# Altium footprint library komponenty_ITS_v1.PcbLib: 81 footprints (part 3 of 6)
Each footprint in its own frame and in the unit in brackets; x right, y up, seen from the top. Pads: shape width x height; smd on the part's side, far side on the other; paste and mask are expansions set on the pad; w line width, h text height; cw(c..) or ccw(c..) is an arc to the next point about the centre after c.
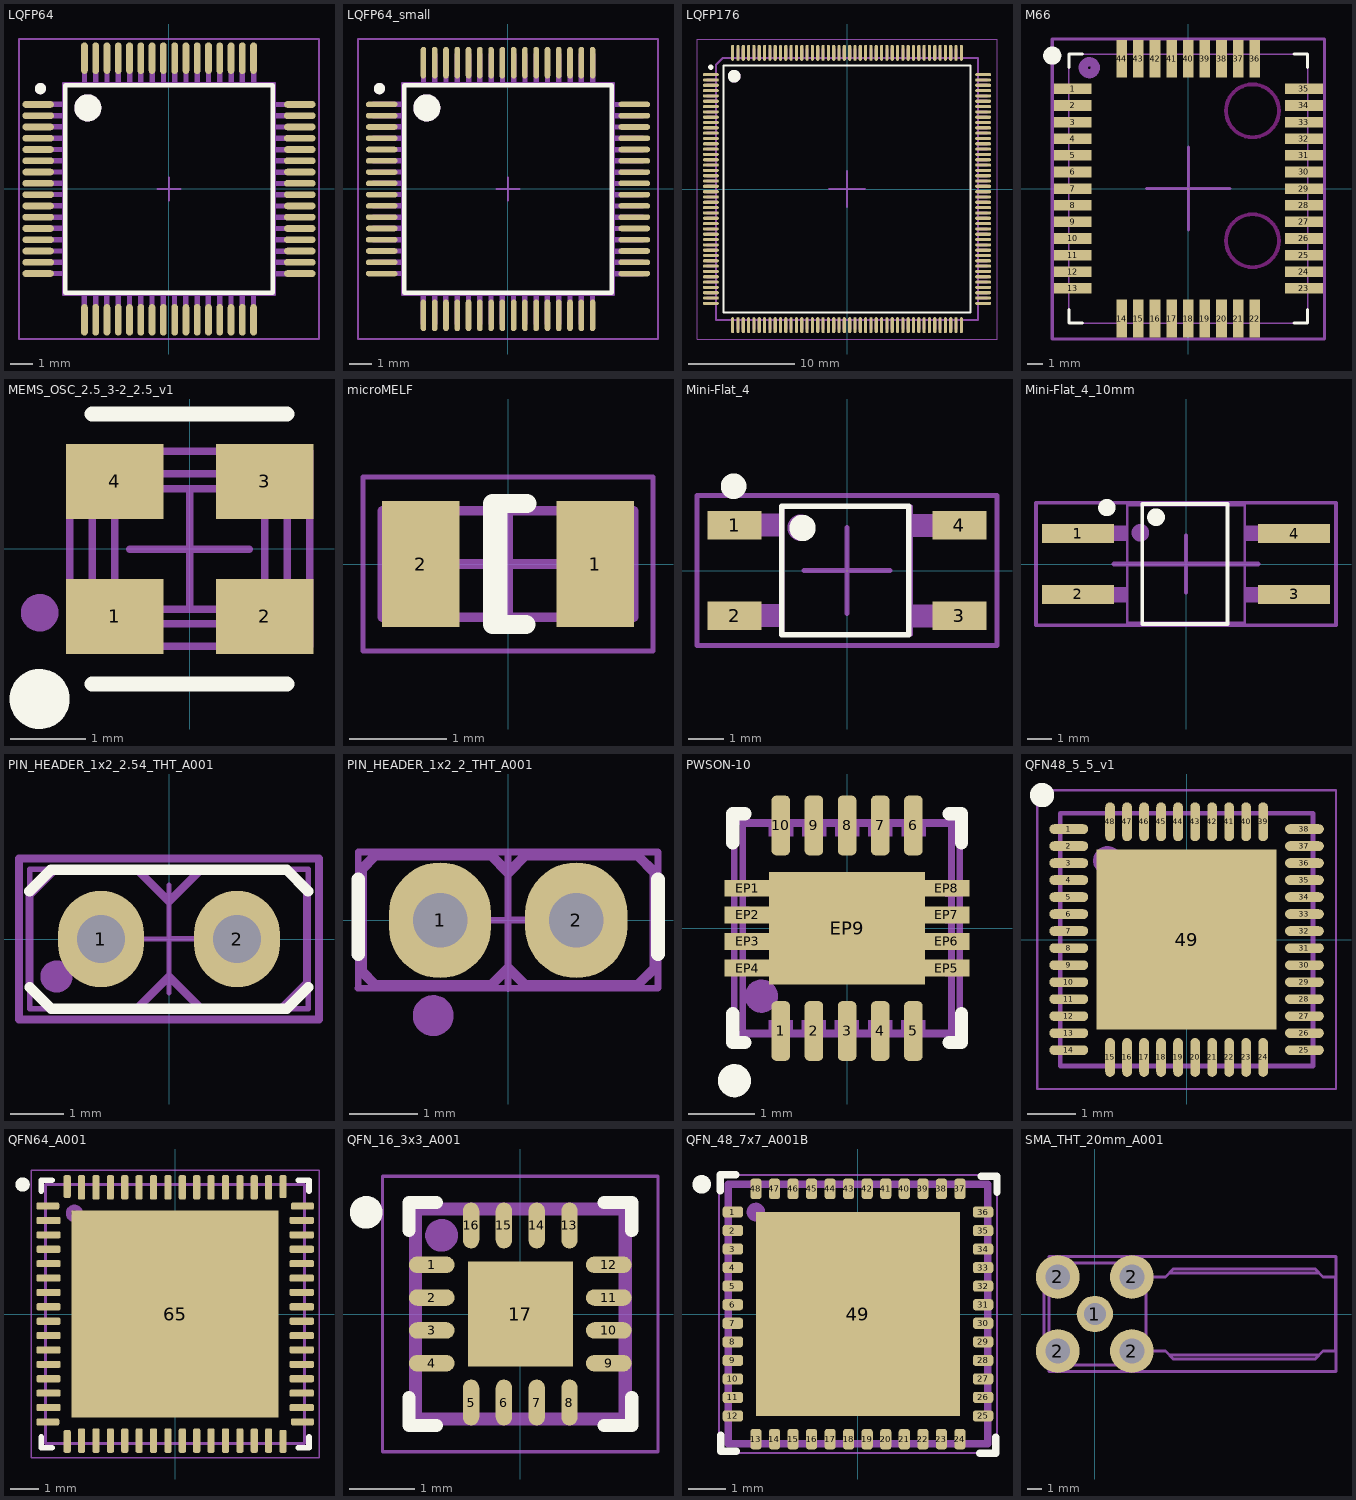
[diagram p2: the footprints below, top view; thin cyan lines are the x and y axes]

## LQFP64 [mm] "TSQFP, 64-Leads, Body 10,00x10,00mm, Pitch 0,50mm"
height 1.6
pads (64):
  oval 1.4x0.3 smd: 1(-5.8,3.75) 2(-5.8,3.25) 3(-5.8,2.75) 4(-5.8,2.25) 5(-5.8,1.75) 6(-5.8,1.25) 7(-5.8,0.75) 8(-5.8,0.25) 9(-5.8,-0.25) 10(-5.8,-0.75) 11(-5.8,-1.25) 12(-5.8,-1.75) 13(-5.8,-2.25) 14(-5.8,-2.75) 15(-5.8,-3.25) 16(-5.8,-3.75) 33(5.8,-3.75) 34(5.8,-3.25) 35(5.8,-2.75) 36(5.8,-2.25) 37(5.8,-1.75) 38(5.8,-1.25) 39(5.8,-0.75) 40(5.8,-0.25) 41(5.8,0.25) 42(5.8,0.75) 43(5.8,1.25) 44(5.8,1.75) 45(5.8,2.25) 46(5.8,2.75) 47(5.8,3.25) 48(5.8,3.75)
  oval 0.3x1.4 smd: 17(-3.75,-5.8) 18(-3.25,-5.8) 19(-2.75,-5.8) 20(-2.25,-5.8) 21(-1.75,-5.8) 22(-1.25,-5.8) 23(-0.75,-5.8) 24(-0.25,-5.8) 25(0.25,-5.8) 26(0.75,-5.8) 27(1.25,-5.8) 28(1.75,-5.8) 29(2.25,-5.8) 30(2.75,-5.8) 31(3.25,-5.8) 32(3.75,-5.8) 49(3.75,5.8) 50(3.25,5.8) 51(2.75,5.8) 52(2.25,5.8) 53(1.75,5.8) 54(1.25,5.8) 55(0.75,5.8) 56(0.25,5.8) 57(-0.25,5.8) 58(-0.75,5.8) 59(-1.25,5.8) 60(-1.75,5.8) 61(-2.25,5.8) 62(-2.75,5.8) 63(-3.25,5.8) 64(-3.75,5.8)
Top Overlay:
  circle w0.6: c-3.6,3.6 r0.3
  circle w0.25: c-5.7,4.45 r0.125
  lines w0.2: -4.6,-4.6 4.6,-4.6 4.6,4.6 -4.6,4.6 -4.6,-4.6
Top M11-12_SMOT:
  circle w0.6: c-3.6,3.6 r0.3
  circle w0.25: c-5.7,4.45 r0.125
  region: 4.707,3.866 4.707,3.628 6.006,3.628 6.006,3.866
  region: 4.707,3.366 4.707,3.128 6.006,3.128 6.006,3.366
  region: 4.707,2.866 4.707,2.628 6.006,2.628 6.006,2.866
  region: 4.707,2.366 4.707,2.128 6.006,2.128 6.006,2.366
  region: 4.707,1.866 4.707,1.628 6.006,1.628 6.006,1.866
  region: 4.707,1.366 4.707,1.128 6.006,1.128 6.006,1.366
  region: 4.707,0.866 4.707,0.628 6.006,0.628 6.006,0.866
  region: 4.707,0.366 4.707,0.128 6.006,0.128 6.006,0.366
  region: 4.707,-0.134 4.707,-0.372 6.006,-0.372 6.006,-0.134
  region: 4.707,-0.634 4.707,-0.872 6.006,-0.872 6.006,-0.634
  region: 4.707,-1.134 4.707,-1.372 6.006,-1.372 6.006,-1.134
  region: 4.707,-1.634 4.707,-1.872 6.006,-1.872 6.006,-1.634
  region: 4.707,-2.134 4.707,-2.372 6.006,-2.372 6.006,-2.134
  region: 4.707,-2.634 4.707,-2.872 6.006,-2.872 6.006,-2.634
  region: 4.707,-3.134 4.707,-3.372 6.006,-3.372 6.006,-3.134
  region: 4.707,-3.634 4.707,-3.872 6.006,-3.872 6.006,-3.634
  rectangle: 2.134,4.707 2.372,6.006
  rectangle: 2.634,4.707 2.872,6.006
  rectangle: 3.134,4.707 3.372,6.006
  rectangle: 3.634,4.707 3.872,6.006
  region: 3.866,-4.707 3.628,-4.707 3.628,-6.006 3.866,-6.006
  region: 3.366,-4.707 3.128,-4.707 3.128,-6.006 3.366,-6.006
  region: 2.866,-4.707 2.628,-4.707 2.628,-6.006 2.866,-6.006
  region: 2.366,-4.707 2.128,-4.707 2.128,-6.006 2.366,-6.006
  rectangle: 0.134,4.707 0.372,6.006
  rectangle: 0.634,4.707 0.872,6.006
  rectangle: 1.134,4.707 1.372,6.006
  rectangle: 1.634,4.707 1.872,6.006
  region: 1.866,-4.707 1.628,-4.707 1.628,-6.006 1.866,-6.006
  region: 1.366,-4.707 1.128,-4.707 1.128,-6.006 1.366,-6.006
  region: 0.866,-4.707 0.628,-4.707 0.628,-6.006 0.866,-6.006
  region: 0.366,-4.707 0.128,-4.707 0.128,-6.006 0.366,-6.006
  rectangle: -1.866,4.707 -1.628,6.006
  rectangle: -1.366,4.707 -1.128,6.006
  rectangle: -0.866,4.707 -0.628,6.006
  rectangle: -0.366,4.707 -0.128,6.006
  region: -0.134,-4.707 -0.372,-4.707 -0.372,-6.006 -0.134,-6.006
  region: -0.634,-4.707 -0.872,-4.707 -0.872,-6.006 -0.634,-6.006
  region: -1.134,-4.707 -1.372,-4.707 -1.372,-6.006 -1.134,-6.006
  region: -1.634,-4.707 -1.872,-4.707 -1.872,-6.006 -1.634,-6.006
  rectangle: -3.866,4.707 -3.628,6.006
  rectangle: -3.366,4.707 -3.128,6.006
  rectangle: -2.866,4.707 -2.628,6.006
  rectangle: -2.366,4.707 -2.128,6.006
  region: -2.134,-4.707 -2.372,-4.707 -2.372,-6.006 -2.134,-6.006
  region: -2.634,-4.707 -2.872,-4.707 -2.872,-6.006 -2.634,-6.006
  region: -3.134,-4.707 -3.372,-4.707 -3.372,-6.006 -3.134,-6.006
  region: -3.634,-4.707 -3.872,-4.707 -3.872,-6.006 -3.634,-6.006
  region: -4.707,2.134 -4.707,2.372 -6.006,2.372 -6.006,2.134
  region: -4.707,2.634 -4.707,2.872 -6.006,2.872 -6.006,2.634
  region: -4.707,3.134 -4.707,3.372 -6.006,3.372 -6.006,3.134
  region: -4.707,3.634 -4.707,3.872 -6.006,3.872 -6.006,3.634
  region: -4.707,0.134 -4.707,0.372 -6.006,0.372 -6.006,0.134
  region: -4.707,0.634 -4.707,0.872 -6.006,0.872 -6.006,0.634
  region: -4.707,1.134 -4.707,1.372 -6.006,1.372 -6.006,1.134
  region: -4.707,1.634 -4.707,1.872 -6.006,1.872 -6.006,1.634
  region: -4.707,-1.866 -4.707,-1.628 -6.006,-1.628 -6.006,-1.866
  region: -4.707,-1.366 -4.707,-1.128 -6.006,-1.128 -6.006,-1.366
  region: -4.707,-0.866 -4.707,-0.628 -6.006,-0.628 -6.006,-0.866
  region: -4.707,-0.366 -4.707,-0.128 -6.006,-0.128 -6.006,-0.366
  region: -4.707,-3.866 -4.707,-3.628 -6.006,-3.628 -6.006,-3.866
  region: -4.707,-3.366 -4.707,-3.128 -6.006,-3.128 -6.006,-3.366
  region: -4.707,-2.866 -4.707,-2.628 -6.006,-2.628 -6.006,-2.866
  region: -4.707,-2.366 -4.707,-2.128 -6.006,-2.128 -6.006,-2.366
  lines w0.1: -4.7,-4.7 4.7,-4.7 4.7,4.7 -4.7,4.7 -4.7,-4.7
Top M13-14_SDES:
  text "'.Designator'" at -6.798,-0.5 h1.2
M15_orgin:
  lines w0.1: -0.5,0 0.5,0 ; 0,-0.5 0,0.5 ; -6.65,-6.65 6.65,-6.65 6.65,6.65 -6.65,6.65 -6.65,-6.65
3D body "LQFP64.step": height 1.6, standoff 0, extent -6,-6 6,6

## LQFP64_small [mm] "TSQFP, 64-Leads, Body 10,00x10,00mm, Pitch 0,50mm"
height 1.6
pads (64):
  oval 1.4x0.25 smd: 1(-5.6,3.75) 2(-5.6,3.25) 3(-5.6,2.75) 4(-5.6,2.25) 5(-5.6,1.75) 6(-5.6,1.25) 7(-5.6,0.75) 8(-5.6,0.25) 9(-5.6,-0.25) 10(-5.6,-0.75) 11(-5.6,-1.25) 12(-5.6,-1.75) 13(-5.6,-2.25) 14(-5.6,-2.75) 15(-5.6,-3.25) 16(-5.6,-3.75) 33(5.6,-3.75) 34(5.6,-3.25) 35(5.6,-2.75) 36(5.6,-2.25) 37(5.6,-1.75) 38(5.6,-1.25) 39(5.6,-0.75) 40(5.6,-0.25) 41(5.6,0.25) 42(5.6,0.75) 43(5.6,1.25) 44(5.6,1.75) 45(5.6,2.25) 46(5.6,2.75) 47(5.6,3.25) 48(5.6,3.75)
  oval 0.25x1.4 smd: 17(-3.75,-5.6) 18(-3.25,-5.6) 19(-2.75,-5.6) 20(-2.25,-5.6) 21(-1.75,-5.6) 22(-1.25,-5.6) 23(-0.75,-5.6) 24(-0.25,-5.6) 25(0.25,-5.6) 26(0.75,-5.6) 27(1.25,-5.6) 28(1.75,-5.6) 29(2.25,-5.6) 30(2.75,-5.6) 31(3.25,-5.6) 32(3.75,-5.6) 49(3.75,5.6) 50(3.25,5.6) 51(2.75,5.6) 52(2.25,5.6) 53(1.75,5.6) 54(1.25,5.6) 55(0.75,5.6) 56(0.25,5.6) 57(-0.25,5.6) 58(-0.75,5.6) 59(-1.25,5.6) 60(-1.75,5.6) 61(-2.25,5.6) 62(-2.75,5.6) 63(-3.25,5.6) 64(-3.75,5.6)
Top Overlay:
  circle w0.25: c-5.7,4.45 r0.125
  circle w0.6: c-3.6,3.6 r0.3
  lines w0.2: -4.6,-4.6 -4.6,4.6 4.6,4.6 4.6,-4.6 -4.6,-4.6
Top M11-12_SMOT:
  circle w0.25: c-5.7,4.45 r0.125
  circle w0.6: c-3.6,3.6 r0.3
  region: -4.707,-2.366 -4.707,-2.128 -6.006,-2.128 -6.006,-2.366
  region: -4.707,-2.866 -4.707,-2.628 -6.006,-2.628 -6.006,-2.866
  region: -4.707,-3.366 -4.707,-3.128 -6.006,-3.128 -6.006,-3.366
  region: -4.707,-3.866 -4.707,-3.628 -6.006,-3.628 -6.006,-3.866
  region: -4.707,-0.366 -4.707,-0.128 -6.006,-0.128 -6.006,-0.366
  region: -4.707,-0.866 -4.707,-0.628 -6.006,-0.628 -6.006,-0.866
  region: -4.707,-1.366 -4.707,-1.128 -6.006,-1.128 -6.006,-1.366
  region: -4.707,-1.866 -4.707,-1.628 -6.006,-1.628 -6.006,-1.866
  region: -4.707,1.634 -4.707,1.872 -6.006,1.872 -6.006,1.634
  region: -4.707,1.134 -4.707,1.372 -6.006,1.372 -6.006,1.134
  region: -4.707,0.634 -4.707,0.872 -6.006,0.872 -6.006,0.634
  region: -4.707,0.134 -4.707,0.372 -6.006,0.372 -6.006,0.134
  region: -4.707,3.634 -4.707,3.872 -6.006,3.872 -6.006,3.634
  region: -4.707,3.134 -4.707,3.372 -6.006,3.372 -6.006,3.134
  region: -4.707,2.634 -4.707,2.872 -6.006,2.872 -6.006,2.634
  region: -4.707,2.134 -4.707,2.372 -6.006,2.372 -6.006,2.134
  region: -3.634,-4.707 -3.872,-4.707 -3.872,-6.006 -3.634,-6.006
  region: -3.134,-4.707 -3.372,-4.707 -3.372,-6.006 -3.134,-6.006
  region: -2.634,-4.707 -2.872,-4.707 -2.872,-6.006 -2.634,-6.006
  region: -2.134,-4.707 -2.372,-4.707 -2.372,-6.006 -2.134,-6.006
  rectangle: -2.366,4.707 -2.128,6.006
  rectangle: -2.866,4.707 -2.628,6.006
  rectangle: -3.366,4.707 -3.128,6.006
  rectangle: -3.866,4.707 -3.628,6.006
  region: -1.634,-4.707 -1.872,-4.707 -1.872,-6.006 -1.634,-6.006
  region: -1.134,-4.707 -1.372,-4.707 -1.372,-6.006 -1.134,-6.006
  region: -0.634,-4.707 -0.872,-4.707 -0.872,-6.006 -0.634,-6.006
  region: -0.134,-4.707 -0.372,-4.707 -0.372,-6.006 -0.134,-6.006
  rectangle: -0.366,4.707 -0.128,6.006
  rectangle: -0.866,4.707 -0.628,6.006
  rectangle: -1.366,4.707 -1.128,6.006
  rectangle: -1.866,4.707 -1.628,6.006
  region: 0.366,-4.707 0.128,-4.707 0.128,-6.006 0.366,-6.006
  region: 0.866,-4.707 0.628,-4.707 0.628,-6.006 0.866,-6.006
  region: 1.366,-4.707 1.128,-4.707 1.128,-6.006 1.366,-6.006
  region: 1.866,-4.707 1.628,-4.707 1.628,-6.006 1.866,-6.006
  rectangle: 1.634,4.707 1.872,6.006
  rectangle: 1.134,4.707 1.372,6.006
  rectangle: 0.634,4.707 0.872,6.006
  rectangle: 0.134,4.707 0.372,6.006
  region: 2.366,-4.707 2.128,-4.707 2.128,-6.006 2.366,-6.006
  region: 2.866,-4.707 2.628,-4.707 2.628,-6.006 2.866,-6.006
  region: 3.366,-4.707 3.128,-4.707 3.128,-6.006 3.366,-6.006
  region: 3.866,-4.707 3.628,-4.707 3.628,-6.006 3.866,-6.006
  rectangle: 3.634,4.707 3.872,6.006
  rectangle: 3.134,4.707 3.372,6.006
  rectangle: 2.634,4.707 2.872,6.006
  rectangle: 2.134,4.707 2.372,6.006
  region: 4.707,-3.634 4.707,-3.872 6.006,-3.872 6.006,-3.634
  region: 4.707,-3.134 4.707,-3.372 6.006,-3.372 6.006,-3.134
  region: 4.707,-2.634 4.707,-2.872 6.006,-2.872 6.006,-2.634
  region: 4.707,-2.134 4.707,-2.372 6.006,-2.372 6.006,-2.134
  region: 4.707,-1.634 4.707,-1.872 6.006,-1.872 6.006,-1.634
  region: 4.707,-1.134 4.707,-1.372 6.006,-1.372 6.006,-1.134
  region: 4.707,-0.634 4.707,-0.872 6.006,-0.872 6.006,-0.634
  region: 4.707,-0.134 4.707,-0.372 6.006,-0.372 6.006,-0.134
  region: 4.707,0.366 4.707,0.128 6.006,0.128 6.006,0.366
  region: 4.707,0.866 4.707,0.628 6.006,0.628 6.006,0.866
  region: 4.707,1.366 4.707,1.128 6.006,1.128 6.006,1.366
  region: 4.707,1.866 4.707,1.628 6.006,1.628 6.006,1.866
  region: 4.707,2.366 4.707,2.128 6.006,2.128 6.006,2.366
  region: 4.707,2.866 4.707,2.628 6.006,2.628 6.006,2.866
  region: 4.707,3.366 4.707,3.128 6.006,3.128 6.006,3.366
  region: 4.707,3.866 4.707,3.628 6.006,3.628 6.006,3.866
  lines w0.1: -4.7,-4.7 -4.7,4.7 4.7,4.7 4.7,-4.7 -4.7,-4.7
Top M13-14_SDES:
  text "'.Designator'" at -6.798,-0.5 h1.2
M15_orgin:
  lines w0.1: -0.5,0 0.5,0 ; 0,-0.5 0,0.5 ; -6.65,-6.65 -6.65,6.65 6.65,6.65 6.65,-6.65 -6.65,-6.65
3D body "LQFP64.step": height 1.6, standoff 0, extent -6,-6 6,6

## LQFP176 [mm]
height 1.6
pads (176):
  oval 1.5x0.3 smd: 1(-12.8,10.75) 2(-12.8,10.25) 3(-12.8,9.75) 4(-12.8,9.25) 5(-12.8,8.75) 6(-12.8,8.25) 7(-12.8,7.75) 8(-12.8,7.25) 9(-12.8,6.75) 10(-12.8,6.25) 11(-12.8,5.75) 12(-12.8,5.25) 13(-12.8,4.75) 14(-12.8,4.25) 15(-12.8,3.75) 16(-12.8,3.25) 17(-12.8,2.75) 18(-12.8,2.25) 19(-12.8,1.75) 20(-12.8,1.25) 21(-12.8,0.75) 22(-12.8,0.25) 23(-12.8,-0.25) 24(-12.8,-0.75) 25(-12.8,-1.25) 26(-12.8,-1.75) 27(-12.8,-2.25) 28(-12.8,-2.75) 29(-12.8,-3.25) 30(-12.8,-3.75) 31(-12.8,-4.25) 32(-12.8,-4.75) 33(-12.8,-5.25) 34(-12.8,-5.75) 35(-12.8,-6.25) 36(-12.8,-6.75) 37(-12.8,-7.25) 38(-12.8,-7.75) 39(-12.8,-8.25) 40(-12.8,-8.75) 41(-12.8,-9.25) 42(-12.8,-9.75) 43(-12.8,-10.25) 44(-12.8,-10.75) 89(12.8,-10.75) 90(12.8,-10.25) 91(12.8,-9.75) 92(12.8,-9.25) 93(12.8,-8.75) 94(12.8,-8.25) 95(12.8,-7.75) 96(12.8,-7.25) 97(12.8,-6.75) 98(12.8,-6.25) 99(12.8,-5.75) 100(12.8,-5.25) 101(12.8,-4.75) 102(12.8,-4.25) 103(12.8,-3.75) 104(12.8,-3.25) 105(12.8,-2.75) 106(12.8,-2.25) 107(12.8,-1.75) 108(12.8,-1.25) 109(12.8,-0.75) 110(12.8,-0.25) 111(12.8,0.25) 112(12.8,0.75) 113(12.8,1.25) 114(12.8,1.75) 115(12.8,2.25) 116(12.8,2.75) 117(12.8,3.25) 118(12.8,3.75) 119(12.8,4.25) 120(12.8,4.75) 121(12.8,5.25) 122(12.8,5.75) 123(12.8,6.25) 124(12.8,6.75) 125(12.8,7.25) 126(12.8,7.75) 127(12.8,8.25) 128(12.8,8.75) 129(12.8,9.25) 130(12.8,9.75) 131(12.8,10.25) 132(12.8,10.75)
  oval 0.3x1.5 smd: 45(-10.75,-12.8) 46(-10.25,-12.8) 47(-9.75,-12.8) 48(-9.25,-12.8) 49(-8.75,-12.8) 50(-8.25,-12.8) 51(-7.75,-12.8) 52(-7.25,-12.8) 53(-6.75,-12.8) 54(-6.25,-12.8) 55(-5.75,-12.8) 56(-5.25,-12.8) 57(-4.75,-12.8) 58(-4.25,-12.8) 59(-3.75,-12.8) 60(-3.25,-12.8) 61(-2.75,-12.8) 62(-2.25,-12.8) 63(-1.75,-12.8) 64(-1.25,-12.8) 65(-0.75,-12.8) 66(-0.25,-12.8) 67(0.25,-12.8) 68(0.75,-12.8) 69(1.25,-12.8) 70(1.75,-12.8) 71(2.25,-12.8) 72(2.75,-12.8) 73(3.25,-12.8) 74(3.75,-12.8) 75(4.25,-12.8) 76(4.75,-12.8) 77(5.25,-12.8) 78(5.75,-12.8) 79(6.25,-12.8) 80(6.75,-12.8) 81(7.25,-12.8) 82(7.75,-12.8) 83(8.25,-12.8) 84(8.75,-12.8) 85(9.25,-12.8) 86(9.75,-12.8) 87(10.25,-12.8) 88(10.75,-12.8) 133(10.75,12.8) 134(10.25,12.8) 135(9.75,12.8) 136(9.25,12.8) 137(8.75,12.8) 138(8.25,12.8) 139(7.75,12.8) 140(7.25,12.8) 141(6.75,12.8) 142(6.25,12.8) 143(5.75,12.8) 144(5.25,12.8) 145(4.75,12.8) 146(4.25,12.8) 147(3.75,12.8) 148(3.25,12.8) 149(2.75,12.8) 150(2.25,12.8) 151(1.75,12.8) 152(1.25,12.8) 153(0.75,12.8) 154(0.25,12.8) 155(-0.25,12.8) 156(-0.75,12.8) 157(-1.25,12.8) 158(-1.75,12.8) 159(-2.25,12.8) 160(-2.75,12.8) 161(-3.25,12.8) 162(-3.75,12.8) 163(-4.25,12.8) 164(-4.75,12.8) 165(-5.25,12.8) 166(-5.75,12.8) 167(-6.25,12.8) 168(-6.75,12.8) 169(-7.25,12.8) 170(-7.75,12.8) 171(-8.25,12.8) 172(-8.75,12.8) 173(-9.25,12.8) 174(-9.75,12.8) 175(-10.25,12.8) 176(-10.75,12.8)
Top Overlay:
  circle w0.6: c-10.6,10.6 r0.3
  circle w0.25: c-12.8,11.45 r0.125
  lines w0.2: -11.6,-11.6 11.6,-11.6 11.6,11.6 -11.6,11.6 -11.6,-11.6
Mechanical 3:
  lines w0.2: -1.7,0 0,0 ; 0,-1.7 0,0 ; 0,1.7 0,0 ; 1.7,0 0,0
Top M11-12_SMOT:
  drawing of 182 lines, arcs and shapes, not listed
Top M13-14_SDES:
  text "'.Designator'" at -11.33,-0.833 h2
M15_orgin:
  lines w0.05: -14.1,-14.1 14.1,-14.1 14.1,14.1 -14.1,14.1 -14.1,-14.1
  lines w0.1: -0.5,0 0.5,0 ; 0,-0.5 0,0.5
3D body "LQFP176_B.step": height 1.6, standoff 0, extent -13,-13 13,13

## M66 [mm]
pads (44):
  rect 2.5x0.7 smd mask+0.1: 1(-7.65,6.6) 2(-7.65,5.5) 3(-7.65,4.4) 4(-7.65,3.3) 5(-7.65,2.2) 6(-7.65,1.1) 7(-7.65,0) 8(-7.65,-1.1) 9(-7.65,-2.2) 10(-7.65,-3.3) 11(-7.65,-4.4) 12(-7.65,-5.5) 13(-7.65,-6.6) 23(7.65,-6.6) 24(7.65,-5.5) 25(7.65,-4.4) 26(7.65,-3.3) 27(7.65,-2.2) 28(7.65,-1.1) 29(7.65,0) 30(7.65,1.1) 31(7.65,2.2) 32(7.65,3.3) 33(7.65,4.4) 34(7.65,5.5) 35(7.65,6.6)
  rect 0.7x2.5 smd mask+0.1: 14(-4.4,-8.6) 15(-3.3,-8.6) 16(-2.2,-8.6) 17(-1.1,-8.6) 18(0,-8.6) 19(1.1,-8.6) 20(2.2,-8.6) 21(3.3,-8.6) 22(4.4,-8.6) 36(4.4,8.6) 37(3.3,8.6) 38(2.2,8.6) 39(1.1,8.6) 40(0,8.6) 41(-1.1,8.6) 42(-2.2,8.6) 43(-3.3,8.6) 44(-4.4,8.6)
Top Layer keep-out:
  circle w0.254: c4.25,-3.45 r1.75
  circle w0.254: c4.25,5.15 r1.75
Top Overlay:
  circle w0.6: c-9,8.8 r0.3
  lines w0.2: -7.9,-8 -7.9,-8.9 -7,-8.9 ; -7.9,8 -7.9,8.9 -7,8.9 ; 7,-8.9 7.9,-8.9 7.9,-8 ; 7,8.9 7.9,8.9 7.9,8
Top M11-12_SMOT:
  circle w0.6: c-6.55,8 r0.4
  region: 2.5,7.55 2.5,8.95 1.9,8.95 1.9,7.55
  region: 0.3,7.55 0.3,8.95 -0.3,8.95 -0.3,7.55
  region: -0.3,-7.55 -0.3,-8.95 0.3,-8.95 0.3,-7.55
  region: 1.9,-7.55 1.9,-8.95 2.5,-8.95 2.5,-7.55
  region: -1.9,7.55 -1.9,8.95 -2.5,8.95 -2.5,7.55
  region: -2.5,-7.55 -2.5,-8.95 -1.9,-8.95 -1.9,-7.55
  rectangle: 6.6,-0.3 8,0.3
  rectangle: 6.6,1.9 8,2.5
  rectangle: 6.6,-2.5 8,-1.9
  region: 4.7,7.55 4.7,8.95 4.1,8.95 4.1,7.55
  region: 4.1,-7.55 4.1,-8.95 4.7,-8.95 4.7,-7.55
  region: 3.6,7.55 3.6,8.95 3,8.95 3,7.55
  region: 3,-7.55 3,-8.95 3.6,-8.95 3.6,-7.55
  region: 1.4,7.55 1.4,8.95 0.8,8.95 0.8,7.55
  region: 0.8,-7.55 0.8,-8.95 1.4,-8.95 1.4,-7.55
  region: -0.8,7.55 -0.8,8.95 -1.4,8.95 -1.4,7.55
  region: -1.4,-7.55 -1.4,-8.95 -0.8,-8.95 -0.8,-7.55
  region: -3,7.55 -3,8.95 -3.6,8.95 -3.6,7.55
  region: -3.6,-7.55 -3.6,-8.95 -3,-8.95 -3,-7.55
  region: -4.1,7.55 -4.1,8.95 -4.7,8.95 -4.7,7.55
  region: -4.7,-7.55 -4.7,-8.95 -4.1,-8.95 -4.1,-7.55
  region: -6.6,2.5 -8,2.5 -8,1.9 -6.6,1.9
  region: -6.6,0.3 -8,0.3 -8,-0.3 -6.6,-0.3
  region: -6.6,-1.9 -8,-1.9 -8,-2.5 -6.6,-2.5
  rectangle: 6.6,6.3 8,6.9
  rectangle: 6.6,4.1 8,4.7
  rectangle: 6.6,5.2 8,5.8
  rectangle: 6.6,3 8,3.6
  rectangle: 6.6,0.8 8,1.4
  rectangle: 6.6,-1.4 8,-0.8
  rectangle: 6.6,-3.6 8,-3
  rectangle: 6.6,-5.8 8,-5.2
  rectangle: 6.6,-4.7 8,-4.1
  rectangle: 6.6,-6.9 8,-6.3
  region: -6.6,6.9 -8,6.9 -8,6.3 -6.6,6.3
  region: -6.6,5.8 -8,5.8 -8,5.2 -6.6,5.2
  region: -6.6,4.7 -8,4.7 -8,4.1 -6.6,4.1
  region: -6.6,3.6 -8,3.6 -8,3 -6.6,3
  region: -6.6,1.4 -8,1.4 -8,0.8 -6.6,0.8
  region: -6.6,-0.8 -8,-0.8 -8,-1.4 -6.6,-1.4
  region: -6.6,-3 -8,-3 -8,-3.6 -6.6,-3.6
  region: -6.6,-4.1 -8,-4.1 -8,-4.7 -6.6,-4.7
  region: -6.6,-5.2 -8,-5.2 -8,-5.8 -6.6,-5.8
  region: -6.6,-6.3 -8,-6.3 -8,-6.9 -6.6,-6.9
  lines w0.1: -7.9,-8.9 7.9,-8.9 7.9,8.9 -7.9,8.9 -7.9,-8.9
Top M13-14_SDES:
  text "'.Designator'" at -0.583,7.931 h1.4
M15_orgin:
  lines w0.2: -2.75,0 0,0 ; 0,-2.75 0,0 ; 0,2.75 0,0 ; 2.75,0 0,0 ; -9,-9.95 -9,9.9 9,9.9 9,-9.95 -9,-9.95
3D body "m66_3d_v2.STEP": height 2.3, standoff 0, extent -7.9,-8.85 7.9,8.85

## MEMS_OSC_2.5_3-2_2.5_v1 [mm] "mems oscilator 2.5x2 or 3.2x2.5"
pads (4):
  rect 1.3x1 smd: 1(-1,-0.9) 2(1,-0.9) 3(1,0.9) 4(-1,0.9)
Top Overlay:
  circle w0.4: c-2,-2 r0.2
  lines w0.2: -1.3,-1.8 1.3,-1.8 ; -1.3,1.8 1.3,1.8
Top M11-12_SMOT:
  circle w0.3: c-2,-0.85 r0.1
  rectangle: -1.65,-1.3 -0.6,-0.6
  rectangle: 0.55,-1.3 1.6,-0.6
  rectangle: 0.55,0.6 1.6,1.3
  rectangle: -1.6,0.6 -0.55,1.3
  lines w0.1: -1.6,-1.3 1.6,-1.3 1.6,1.3 -1.6,1.3 -1.6,-1.3
Top M13-14_SDES:
  text "'.Designator'" at -3.449,2.2 h0.6
M15_orgin:
  lines w0.1: -0.798,-0.002 0.002,-0.002 ; -0.002,-0.002 0.798,-0.002 ; 0,-0.802 0,-0.002 ; 0,0 0,0.8 ; -1.6,-1.3 1.6,-1.3 1.6,1.3 -1.6,1.3 -1.6,-1.3 ; -1.3,-1 1.3,-1 1.3,1 -1.3,1 -1.3,-1 ; -1,-0.802 1,-0.802 1,0.8 -1,0.8 -1,-0.802
3D body: height 0.8, standoff 0, extent -1.508,-1.3 1.511,1.3
3D body: height 0.8, standoff 0, extent 1.506,0.58 1.55,1.127
3D body: height 0.8, standoff 0, extent 1.506,-1.22 1.55,-0.673
3D body: height 0.8, standoff 0, extent -1.55,0.673 -1.506,1.22
3D body: height 0.81, standoff 0.8, extent -1.298,-1.101 -0.7,-0.502
3D body: height 0.8, standoff 0, extent -1.55,-1.127 -1.506,-0.58

## microMELF [mm] "MELF Diode, 2-Leads, Body 1,90x1,15mm, IPC Medium Density"
height 1.1
pads (2):
  rect 0.8x1.3 smd: 1(0.9,0) 2(-0.9,0)
Top Overlay:
  rectangle: -0.255,-0.624 -0.005,0.626
  lines w0.2: 0.183,-0.625 -0.161,-0.625 -0.161,0.625 0.194,0.625
Top M11-12_SMOT:
  rectangle: -0.891,-0.55 -0.639,0.55
  region: -1.105,0.55 -1.3,0.55 -1.3,-0.55 -1.105,-0.55
  rectangle: 1.105,-0.55 1.3,0.55
  lines w0.1: -1.3,-0.55 -1.3,0.55 1.3,0.55 1.3,-0.55 -1.3,-0.55
Top M13-14_SDES:
  text "'.Designator'" at -3.065,-0.192 h0.7
M15_orgin:
  lines w0.05: -1.5,-0.9 1.5,-0.9 1.5,0.9 -1.5,0.9 -1.5,-0.9
  lines w0.1: -0.5,0 0.5,0 ; 0,-0.5 0,0.5
3D body "microMELF.step": height 1.15, standoff 0, extent -0.95,-0.574 0.95,0.574

## Mini-Flat_4 [mm]
pads (4):
  rect 1.5x0.8 smd: 1(-3.15,1.27) 2(-3.15,-1.27) 3(3.15,-1.27) 4(3.15,1.27)
Top Overlay:
  circle w0.508: c-3.175,2.362 r0.105
  circle w0.508: c-1.245,1.194 r0.114
  lines w0.152: -1.829,-1.8 1.727,-1.8 1.727,1.8 -1.829,1.8 -1.829,-1.8
Top M11-12_SMOT:
  circle w0.508: c-1.3,1.2 r0.114
  rectangle: -3.5,-1.587 -1.8,-0.94
  rectangle: -3.5,0.953 -1.8,1.6
  region: 3.5,-0.953 1.8,-0.953 1.8,-1.6 3.5,-1.6
  region: 3.5,1.587 1.8,1.587 1.8,0.94 3.5,0.94
  lines w0.1: -1.8,-1.8 -1.8,1.8 1.8,1.8 1.8,-1.8 -1.8,-1.8
Top M13-14_SDES:
  text "'.Designator'" at -4.532,-0.333 h0.8
M15_orgin:
  lines w0.15: -1.194,0 0,0 ; 0,-1.194 0,0 ; 0,1.194 0,0 ; 1.194,0 0,0 ; -4.2,-2.1 -4.2,2.1 4.2,2.1 4.2,-2.1 -4.2,-2.1
3D body "Mini-FlatPackage_4.STEP": height 2, standoff -0.1, extent -3.525,-1.8 3.475,1.8